# Altium footprint library PcbLib1.PcbLib: 157 footprints (part 2 of 10)
Each footprint in its own frame and in the unit in brackets; x right, y up, seen from the top. Pads: shape width x height; smd on the part's side, far side on the other; paste and mask are expansions set on the pad; w line width, h text height; cw(c..) or ccw(c..) is an arc to the next point about the centre after c.
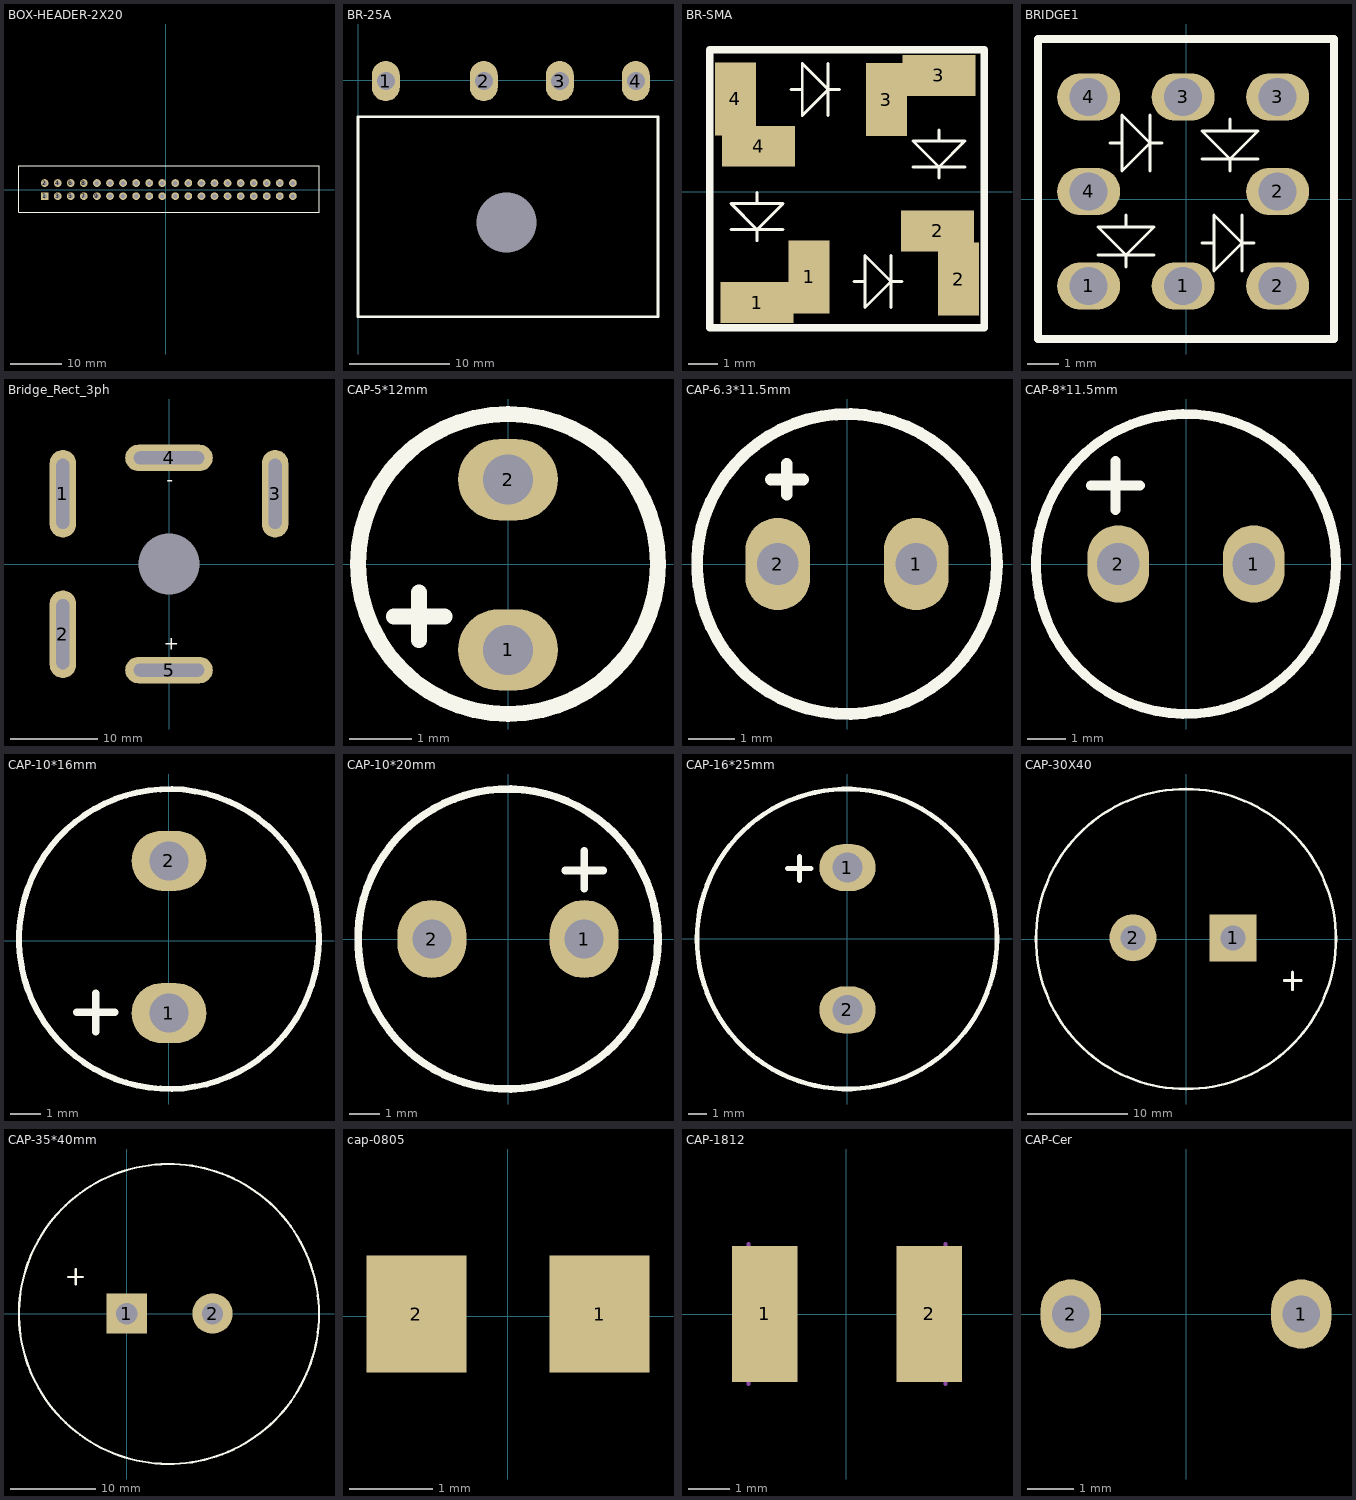
[diagram p1: the footprints below, top view; thin cyan lines are the x and y axes]

## BOX-HEADER-2X20 [mm]
pads (40):
  rect 1.5x1.5 hole 0.9: 1(-23.51,-1.262)
  round 1.5 hole 0.9: 2(-23.51,1.278) 3(-20.97,-1.262) 4(-20.97,1.278) 5(-18.43,-1.262) 6(-18.43,1.278) 7(-15.89,-1.262) 8(-15.89,1.278) 9(-13.35,-1.262) 10(-13.35,1.278) 11(-10.81,-1.262) 12(-10.81,1.278) 13(-8.27,-1.262) 14(-8.27,1.278) 15(-5.73,-1.262) 16(-5.73,1.278) 17(-3.19,-1.262) 18(-3.19,1.278) 19(-0.65,-1.262) 20(-0.65,1.278) 21(1.89,-1.262) 22(1.89,1.278) 23(4.43,-1.262) 24(4.43,1.278) 25(6.97,-1.262) 26(6.97,1.278) 27(9.51,-1.262) 28(9.51,1.278) 29(12.05,-1.262) 30(12.05,1.278) 31(14.59,-1.262) 32(14.59,1.278) 33(17.13,-1.262) 34(17.13,1.278) 35(19.67,-1.262) 36(19.67,1.278) 37(22.21,-1.262) 38(22.21,1.278) 39(24.75,-1.262) 40(24.75,1.278)
Top Overlay:
  lines w0.2: -28.5,-4.375 29.825,-4.375 29.825,4.625 -28.5,4.625 -28.5,-4.375
3D body "612040235121.stp": height 9.4, standoff -2.6, extent -28.6,-4.4 29.86,4.65

## BR-25A [mm]
pads (5):
  oval 2.8x4 hole 1.8: 1(2.75,-0.1) 2(12.55,-0.1) 3(20.15,-0.1) 4(27.75,-0.1)
  round 0 hole 6: 10(14.825,-14.25)
Top Overlay:
  lines w0.254: -0.025,-23.675 29.975,-23.675 29.975,-3.675 -0.025,-3.675 -0.025,-23.675
3D body "User Library-Silicon Bridge Rectifiers KBJ1004.STEP": height 24.85, standoff -12.35, extent -0.05,-1.825 29.95,2.975

## BR-SMA [mm]
pads (8):
  rect 2.5x1.4 smd: 1(11.575,-3.8) 2(17.75,-1.35) 3(17.8,3.975) 4(11.625,1.55)
  rect 1.4x2.5 smd: 1(13.35,-2.925) 2(18.475,-3) 3(16,3.15) 4(10.825,3.175)
Top Overlay:
  lines w0.1: 10.683,-1.305 12.461,-1.305 ; 11.572,-1.686 11.572,-1.305 ; 11.572,-0.416 11.572,-0.035 ; 12.735,3.497 13.116,3.497 ; 14.005,2.608 14.005,4.386 ; 14.386,3.497 14.005,3.497 ; 14.885,-3.078 15.266,-3.078 ; 16.155,-3.967 16.155,-2.189 ; 16.536,-3.078 16.155,-3.078 ; 16.908,0.845 18.686,0.845 ; 17.797,0.464 17.797,0.845 ; 17.797,1.734 17.797,2.115 ; 11.572,-1.305 12.461,-0.416 10.683,-0.416 11.572,-1.305 ; 14.005,3.497 13.116,4.386 13.116,2.608 14.005,3.497 ; 16.155,-3.078 15.266,-2.189 15.266,-3.967 16.155,-3.078 ; 17.797,0.845 18.686,1.734 16.908,1.734 17.797,0.845
  lines w0.254: 9.951,-4.67 9.951,4.855 19.349,4.855 19.349,-4.67 9.951,-4.67
3D body "User Library-DIOM5528X26.STEP": height 2.6, standoff 0.03, extent 13.325,-4.325 18.825,-1.525
3D body "User Library-DIOM5528X26.STEP": height 2.6, standoff 0.03, extent 10.225,-4.125 13.025,1.375
3D body "User Library-DIOM5528X26.STEP": height 2.6, standoff 0.03, extent 10.45,1.725 15.95,4.525
3D body "User Library-DIOM5528X26.STEP": height 2.6, standoff 0.03, extent 16.35,-1.225 19.15,4.275

## BRIDGE1 [mm]
pads (8):
  oval 2x1.5 hole 1.2: 1(-3.091,-2.761) 1(-0.091,-2.761) 2(2.909,-2.761) 2(2.909,0.239) 3(-0.091,3.239) 3(2.909,3.239) 4(-3.091,0.239) 4(-3.091,3.239)
Top Overlay:
  lines w0.1: -2.794,-1.778 -1.016,-1.778 ; -2.413,1.778 -2.032,1.778 ; -1.905,-2.159 -1.905,-1.778 ; -1.905,-0.889 -1.905,-0.508 ; -1.143,0.889 -1.143,2.667 ; -0.762,1.778 -1.143,1.778 ; 0.508,-1.397 0.889,-1.397 ; 0.508,1.27 2.286,1.27 ; 1.397,0.889 1.397,1.27 ; 1.397,2.159 1.397,2.54 ; 1.778,-2.286 1.778,-0.508 ; 2.159,-1.397 1.778,-1.397 ; -1.905,-1.778 -2.794,-0.889 -1.016,-0.889 -1.905,-1.778 ; -1.143,1.778 -2.032,0.889 -2.032,2.667 -1.143,1.778 ; 1.397,1.27 0.508,2.159 2.286,2.159 1.397,1.27 ; 1.778,-1.397 0.889,-2.286 0.889,-0.508 1.778,-1.397
  lines w0.254: -4.699,-4.445 4.699,-4.445 4.699,5.08 -4.699,5.08 -4.699,-4.445
3D body "User Library-MiniMelf-2.STEP": height 1.6, standoff 0, extent -3.9,-3.105 -2.3,0.595
3D body "User Library-MiniMelf-2.STEP": height 1.6, standoff 0, extent -3.345,2.3 0.355,3.9
3D body "User Library-MiniMelf-2.STEP": height 1.6, standoff 0, extent -0.47,-3.525 3.23,-1.925
3D body "User Library-MiniMelf-2.STEP": height 1.6, standoff 0, extent 2.075,-0.155 3.675,3.545

## Bridge_Rect_3ph [mm]
pads (6):
  oval 3x10 hole 1.5 slot 8 at 90 deg: 1(-12.1,8) 2(-12.1,-8) 3(12.1,8)
  oval 10x3 hole 1.5 slot 8 at 0 deg: 4(0,12.1) 5(0,-12.1)
  round 0 hole 7: 7(0,0)
Top Overlay:
  text "-" at 0.5,10.075 h1.52
  text "+" at -0.6,-9.8 h1.52
3D body "User Library-VS-36MT160.STEP": height 4, standoff -18, extent -14.25,-14.25 14.25,14.25

## CAP-5*12mm [mm]
pads (2):
  oval 1.6x1.3 hole 0.8: 1(0,-1.375) 2(0,1.35)
Top Overlay:
  circle w0.254: c0,0 r2.4
  lines w0.254: -1.829,-0.838 -1.016,-0.838 ; -1.422,-1.219 -1.422,-0.457
3D body "User Library-ECAP5_12_20.STEP": height 12, standoff -2.3, extent -2.498,-2.5 2.498,2.5

## CAP-6.3*11.5mm [mm]
pads (2):
  oval 1.4x2 hole 0.9: 1(1.5,0) 2(-1.5,0)
Top Overlay:
  circle w0.254: c0,0 r3.25
  lines w0.254: -1.65,1.832 -0.95,1.832 ; -1.304,1.5 -1.304,2.175
3D body "User Library-CapAluRadial_D63H110.STEP": height 12.5, standoff -3, extent -3.4,-3.399 3.4,3.399

## CAP-8*11.5mm [mm]
pads (2):
  oval 1.6x2 hole 1.1: 1(1.753,0) 2(-1.753,0)
Top Overlay:
  circle w0.254: c0,0 r3.883
  lines w0.254: -2.464,2.032 -1.194,2.032 ; -1.829,1.397 -1.829,2.667
3D body "User Library-Cap-EL(8x11_5-3_5).STEP": height 11.5, standoff -3.3, extent -4,-3.998 4.002,3.998

## CAP-10*16mm [mm]
pads (2):
  oval 2.5x2 hole 1.3: 1(0,-2.413) 2(0,2.667)
Top Overlay:
  circle w0.2: c0,0.059 r5
  lines w0.254: -3.073,-2.388 -1.803,-2.388 ; -2.438,-3.023 -2.438,-1.753
3D body "User Library-Cap-EL(10x16-5).STEP": height 16, standoff -3.3, extent -5,-5.001 4.995,5.001

## CAP-10*20mm [mm]
pads (2):
  oval 2.3x2.6 hole 1.3: 1(2.54,0) 2(-2.54,0)
Top Overlay:
  circle w0.254: c0,0 r5
  lines w0.254: 1.905,2.282 3.175,2.282 ; 2.54,1.672 2.54,2.942
3D body "User Library-CE_R200_D400_H800.STEP": height 20.32, standoff -2.9, extent -5.135,-4.905 5.025,5.255

## CAP-16*25mm [mm]
pads (2):
  oval 3x2.5 hole 1.6: 1(0,3.785) 2(0,-3.81)
Top Overlay:
  circle w0.254: c-0.025,-0.025 r8
  lines w0.254: -3.2,3.734 -1.93,3.734 ; -2.565,3.099 -2.565,4.369
3D body "User Library-CE_R300_D650_H1000.STEP": height 25.4, standoff -3.5, extent -8.25,-8.25 8.25,8.25

## CAP-30X40 [mm]
pads (2):
  rect 4.7x4.7 hole 2.5: 1(4.7,0.125)
  round 4.7 hole 2.5: 2(-5.3,0.125)
Top Overlay:
  circle w0.254: c0,0.001 r15
  lines w0.254: 9.825,-4.15 11.525,-4.15 ; 10.65,-5.075 10.65,-3.3
3D body "User Library-Assy_CE_R400_D1200_H1450.STEP": height 36.83, standoff -6.89, extent -15.275,-15.09 15.205,15.39

## CAP-35*40mm [mm]
pads (2):
  rect 4.7x4.7 hole 2.5: 1(0,0)
  round 4.7 hole 2.5: 2(10,0)
Top Overlay:
  circle w0.254: c4.925,-0.05 r17.5
  lines w0.254: -6.825,4.275 -5.125,4.275 ; -5.95,3.425 -5.95,5.2
3D body "User Library-part1-165.STEP": height 40.2, standoff -3.24, extent -12.527,-17.55 22.491,17.45

## cap-0805 [mm]
pads (2):
  rect 1.2x1.4 smd: 1(1.1,0.025) 2(-1.1,0.025)
3D body "User Library-User Library-0805(2012M) Cap.STEP": height 1.24, standoff -0.05, extent -1.05,-0.62 0.95,0.67

## CAP-1812 [mm]
pads (2):
  rect 1.6x3.3 smd: 1(-1.981,0.006) 2(2.019,0.006)
Mechanical 13:
  lines w0.1: -2.381,-1.694 -2.381,1.706 ; 2.419,-1.694 2.419,1.706
3D body "User Library-1812 SMD Capacitor.STEP": height 1.6, standoff 0, extent -2.25,-1.6 2.25,1.6

## CAP-Cer [mm]
pads (2):
  oval 1.3x1.5 hole 0.8: 1(2.489,0) 2(-2.489,0)
3D body "User Library-CAPRR500W50L720T450H950_WIMA_1E.STEP": height 9.25, standoff -2.75, extent -3.6,-2.275 3.6,2.225